# Altium footprint library Capacitor.PcbLib: 47 footprints (part 3 of 3)
Each footprint in its own frame and in the unit in brackets; x right, y up, seen from the top. Pads: shape width x height; smd on the part's side, far side on the other; paste and mask are expansions set on the pad; w line width, h text height; cw(c..) or ccw(c..) is an arc to the next point about the centre after c.
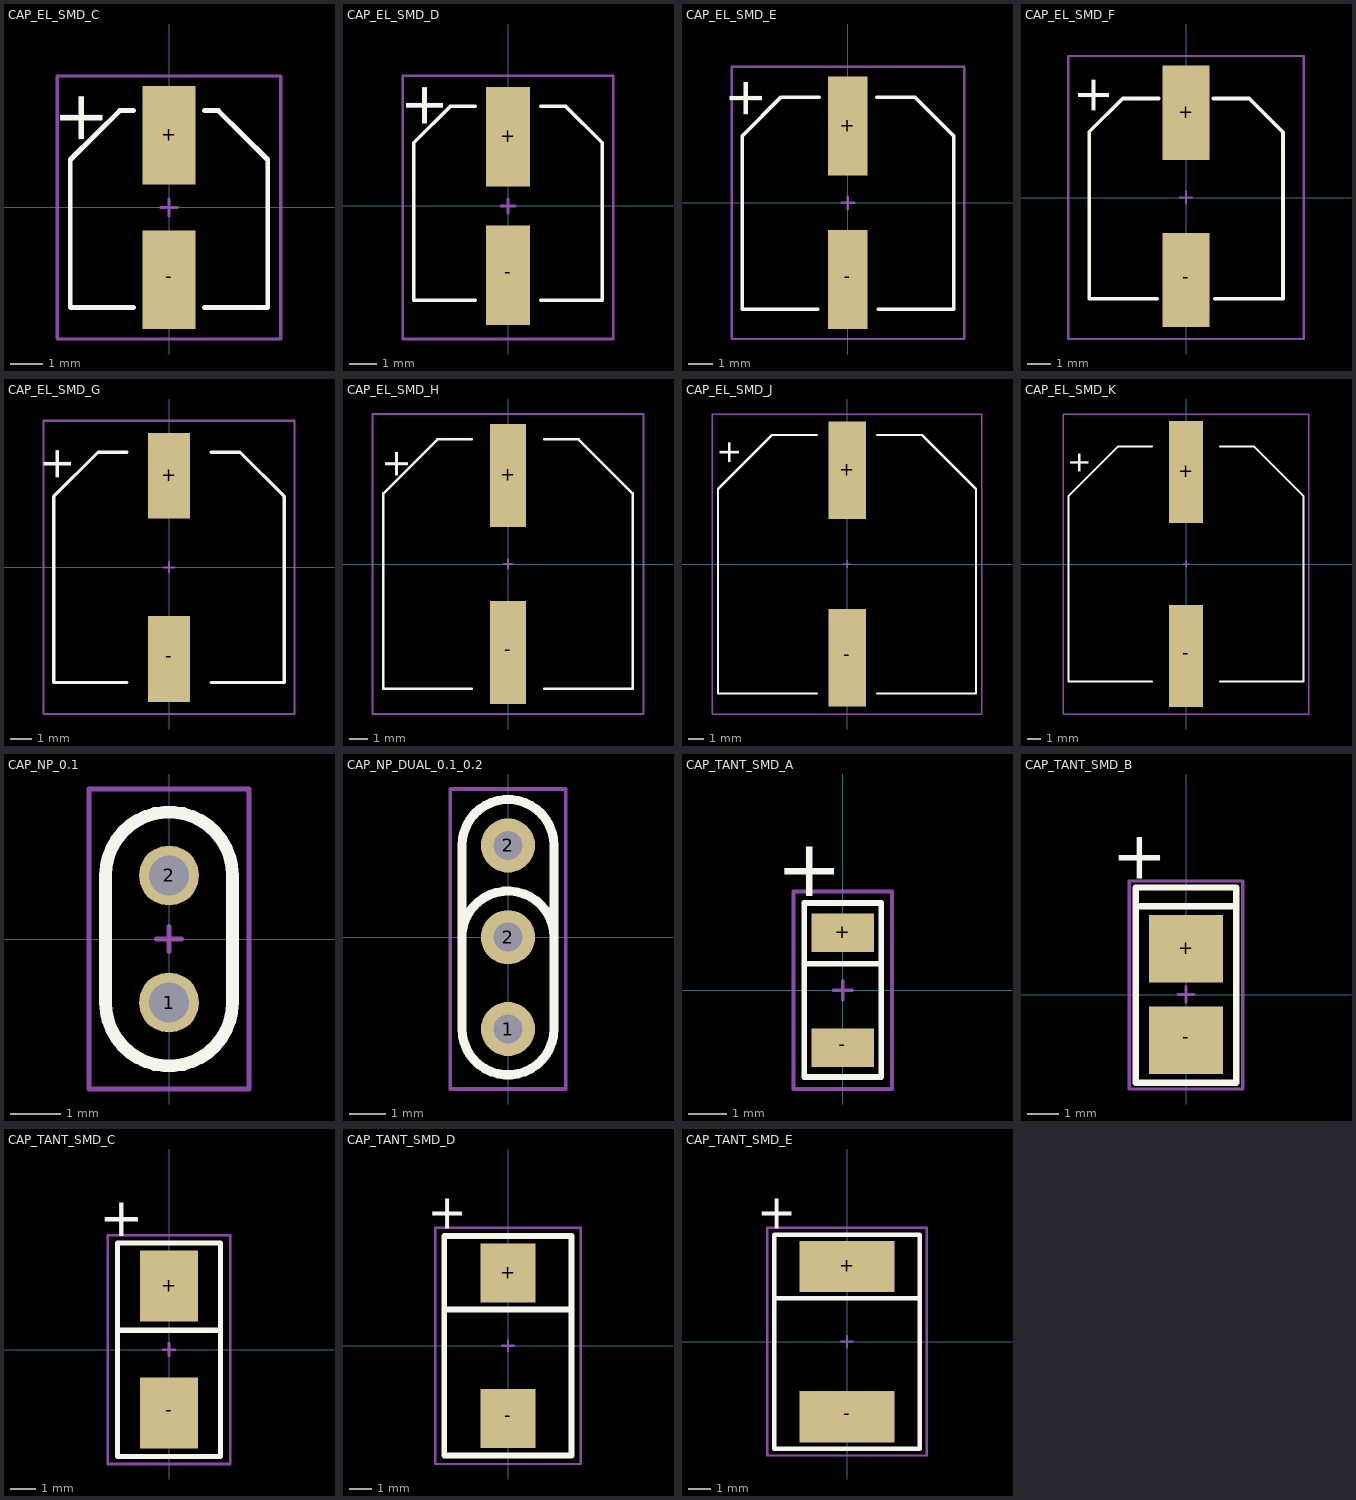
[diagram p2: the footprints below, top view; thin cyan lines are the x and y axes]

## CAP_EL_SMD_C [mil] "Capacitor Eletrolítico SMD Case C"
pads (2):
  rect 63x118 smd: +(0,86.6) -(0,-86.6)
Top Overlay:
  lines w5.9: -42.32,116.2 -58.4,116.2 -59.1,116 -117.9,57.5 -118.2,56.8 -118.2,-119.2 -117.8,-119.6 -42.24,-119.6 ; 42.24,-119.6 117.8,-119.6 118.2,-119.2 118.2,56.8 117.9,57.5 59.1,116 58.4,116.2 42.32,116.2
  text "+" at -129.92,141.73 h60
Mechanical 15:
  lines w3.94: -9.84,0 9.84,0 ; 0,-9.84 0,9.84 ; -133.86,-157.48 -133.86,157.48 133.86,157.48 133.86,-157.48 -133.86,-157.48
3D body "CAP_EL_SMD_C.STEP": height 212.99, standoff 0, extent -104.33,-118.11 104.33,114.18

## CAP_EL_SMD_D [mm] "Capacitor Eletrolítico SMD Case D"
pads (2):
  rect 1.6x3.6 smd: +(0,2.5) -(0,-2.5)
Top Overlay:
  lines w0.127: -1.175,-3.4 -3.4,-3.4 -3.4,2.275 -2.075,3.6 -1.175,3.6 ; 1.175,-3.4 3.4,-3.4 3.4,2.275 2.075,3.6 1.175,3.6
  text "+" at -3.675,4.5 h1.52
Mechanical 15:
  lines w0.1: -0.25,0 0.25,0 ; 0,-0.25 0,0.25 ; -3.8,-4.8 3.8,-4.8 3.8,4.7 -3.8,4.7 -3.8,-4.8
3D body "CAP_EL_SMD_D.STEP": height 5.4, standoff 0, extent -3.325,-3.375 3.275,3.625

## CAP_EL_SMD_E [mm] "Capacitor Eletrolítico SMD Case E"
pads (2):
  rect 1.6x4 smd: +(0,3.1) -(0,-3.1)
Top Overlay:
  lines w0.15: -1.225,-4.3 -4.275,-4.299 -4.275,2.708 -2.7,4.275 -1.167,4.275 ; 1.167,4.275 2.7,4.275 4.275,2.708 4.275,-4.299 1.225,-4.3
  text "+" at -4.775,5.1 h1.52
Mechanical 15:
  lines w0.1: -0.25,0 0.25,0 ; 0,-0.25 0,0.25 ; -4.7,-5.5 -4.7,5.5 4.7,5.5 4.7,-5.5 -4.7,-5.5
3D body "CAP_EL_SMD_E.STEP": height 6.2, standoff 0, extent -4.15,-4.5 4.15,4.5

## CAP_EL_SMD_F [mm] "Capacitor Eletrolítico SMD Case F"
pads (2):
  rect 2x4 smd: +(0,3.6) -(0,-3.5)
Top Overlay:
  lines w0.15: -1.225,-4.3 -4.1,-4.3 -4.1,2.789 -2.682,4.2 -1.167,4.2 ; 1.167,4.2 2.682,4.2 4.114,2.775 4.114,-4.3 1.225,-4.3
  text "+" at -4.575,5.2 h1.52
Mechanical 15:
  lines w0.1: -0.25,0 0.25,0 ; 0,-0.25 0,0.25 ; -5,-6 -5,6 5,6 5,-6 -5,-6
3D body "CAP_EL_SMD_F.STEP": height 10.2, standoff 0, extent -4.125,-5 4.175,4.9

## CAP_EL_SMD_G [mm] "Capacitor Eletrolítico SMD Case G"
pads (2):
  rect 2x4.1 smd paste+0: +(0,4.375) -(0,-4.375)
Top Overlay:
  lines w0.15: -2,-5.5 -5.5,-5.5 -5.5,3.39 -3.39,5.5 -2,5.5 ; 2,-5.5 5.5,-5.5 5.5,3.39 3.39,5.5 2,5.5
  text "+" at -5.975,5.8 h1.52
Mechanical 15:
  lines w0.1: -0.25,0 0.25,0 ; 0,-0.25 0,0.25 ; -6,-7 6,-7 6,7 -6,7 -6,-7
3D body "CAP_EL_SMD_G.STEP": height 10.2, standoff 0, extent -5.15,-5.775 5.15,5.825

## CAP_EL_SMD_H [mm] "Capacitor Eletrolítico SMD Case H"
pads (2):
  rect 2x5.7 smd paste+0: +(0,4.9) -(0,-4.9)
Top Overlay:
  lines w0.15: -2,-6.9 -6.9,-6.9 -6.9,3.9 -3.9,6.9 -2,6.9 ; 2,-6.9 6.9,-6.9 6.9,3.9 3.9,6.9 2,6.9
  text "+" at -6.8,6.4 h1.52
Mechanical 15:
  lines w0.1: -0.25,0 0.25,0 ; 0,-0.25 0,0.25 ; -7.5,-8.3 7.5,-8.3 7.5,8.3 -7.5,8.3 -7.5,-8.3
3D body "User Library-capacitor size H13.STEP": height 13.5, standoff -0.01, extent -6.75,-6.9 6.75,6.9

## CAP_EL_SMD_J [mm] "Capacitor Eletrolítico SMD Case J"
height 16.5
pads (2):
  rect 2.5x6.5 smd paste+0: +(0,6.25) -(0,-6.25)
Top Overlay:
  lines w0.15: -2,-8.625 -8.6,-8.625 -8.6,5 -5,8.6 -2,8.6 ; 2,-8.625 8.6,-8.625 8.6,5 5,8.6 2,8.6
  text "+" at -8.475,8.3 h1.52
Mechanical 15:
  lines w0.1: -0.25,0 0.25,0 ; 0,-0.25 0,0.25 ; -9,-10 9,-10 9,10 -9,10 -9,-10
3D body "Capacitor Elect size J16.step": height 16.5, standoff -0.01, extent -8.5,-8.85 8.5,8.85

## CAP_EL_SMD_K [mm] "Capacitor Eletrolítico SMD Case K"
pads (2):
  rect 2.5x7.5 smd paste+0: +(0,6.75) -(0,-6.75)
Top Overlay:
  lines w0.15: -2.5,-8.6 -8.6,-8.6 -8.6,5 -5,8.6 -2.5,8.6 ; 2.5,-8.6 8.6,-8.6 8.6,5 5,8.6 2.5,8.6
  text "+" at -8.475,8.3 h1.52
Mechanical 15:
  lines w0.1: -0.25,0 0.25,0 ; 0,-0.25 0,0.25 ; -9,-11 -9,11 9,11 9,-11 -9,-11
3D body "Capacitor Elect size J16.step": height 16.56, standoff 0.05, extent -8.5,-8.85 8.5,8.85

## CAP_NP_0.1 [mm] "Capacitor PTH"
pads (2):
  round 1.2 hole 0.8 mask+0.127: 1(0,-1.27) 2(0,1.27)
Top Overlay:
  lines w0.254: -1.27,-1.27 ccw(c0,-1.27) 1.27,-1.27 1.27,1.27 ccw(c0,1.27) -1.27,1.27 -1.27,-1.27
Mechanical 15:
  lines w0.1: -0.25,0 0.25,0 ; 0,-0.25 0,0.25 ; -1.6,-3 -1.6,3 1.6,3 1.6,-3 -1.6,-3
3D body "Capacitor Tantalo PTH.STEP": height 11.94, standoff -3.02, extent -1.587,-3.014 1.587,2.963

## CAP_NP_DUAL_0.1_0.2 [mm] "Capacitor PTH"
pads (3):
  round 1.5 hole 0.8 mask+0.127: 1(0,-2.54) 2(0,0) 2(0,2.54)
Top Overlay:
  lines w0.254: -1.27,0.127 cw(c0,0) 1.276,0 ; -1.27,-2.54 ccw(c0,-2.54) 1.27,-2.54 1.27,2.54 ccw(c0,2.54) -1.27,2.54 -1.27,-2.54
Mechanical 15:
  lines w0.1: -0.25,0 0.25,0 ; 0,-0.25 0,0.25 ; -1.6,-4.2 -1.6,4.1 1.6,4.1 1.6,-4.2 -1.6,-4.2
3D body "CAP_NP_0.1.step": height 4.27, standoff -2.47, extent -1.079,-2.794 1.08,2.794

## CAP_TANT_SMD_A [mil] "Capacitor Tantalo SMD Case A"
pads (2):
  rect 65x40 smd paste+0: +(0,59.6) -(0,-59.6)
Top Overlay:
  lines w5.9: -40,90.55 -40,-90 40,-90 40,90.55
  lines w6: -40,90.55 40,90.55 ; -39.37,27.56 39.37,27.56
  text "+" at 0,148.62 h60
Mechanical 15:
  lines w3.94: -9.84,0 9.84,0 ; 0,-9.84 0,9.84 ; -51.18,-102.36 -51.18,102.36 51.18,102.36 51.18,-102.36 -51.18,-102.36
3D body "CAP_TANT_SMD_A.step": height 63.39, standoff 0, extent -31.5,-62.81 31.5,62.81

## CAP_TANT_SMD_B [mm] "Capacitor Tantalo SMD Case B"
pads (2):
  rect 2.35x2.15 smd: +(0,1.45) -(0,-1.45)
Top Overlay:
  lines w0.2: -1.6,2.8 1.6,2.8 ; -1.6,-2.8 -1.6,3.4 1.6,3.4 1.6,-2.8 -1.6,-2.8
  text "+" at -0.6,5 h1.52
Mechanical 15:
  lines w0.1: -0.25,0 0.25,0 ; 0,-0.25 0,0.25 ; -1.8,-3 -1.8,3.6 1.8,3.6 1.8,-3 -1.8,-3
3D body "CAP_TANT_SMD_B.step": height 1.91, standoff 0, extent -1.425,-1.746 1.375,1.746

## CAP_TANT_SMD_C [mil] "Capacitor Tantalo SMD Case C"
pads (2):
  rect 90x110 smd: +(0,98.43) -(0,-98.43)
Top Overlay:
  lines w7.87: -80,30 80,30 ; -80,-165.35 80,-165.35 80,165.35 -80,165.35 -80,-165.35
  text "+" at -39.37,227.36 h60
Mechanical 15:
  lines w3.94: -9.84,0 9.84,0 ; 0,-9.84 0,9.84 ; -94.49,-177.17 94.49,-177.17 94.49,177.17 -94.49,177.17 -94.49,-177.17
3D body "CAP_TANT_SMD_C.step": height 98.82, standoff 0, extent -62.99,-117.01 62.99,118.97

## CAP_TANT_SMD_D [mm] "Capacitor Tantalo SMD Case D"
height 3.7
pads (2):
  rect 2.4x2.6 smd: +(0,3.2) -(0,-3.2)
Top Overlay:
  lines w0.254: -2.8,1.6 2.788,1.6 ; -2.8,-4.826 -2.8,4.826 2.794,4.826 2.794,-4.826 -2.8,-4.826
  text "+" at -1.8,6.475 h1.52
Mechanical 15:
  lines w0.1: -0.25,0 0.25,0 ; 0,-0.25 0,0.25 ; -3.2,-5.2 3.2,-5.2 3.2,5.2 -3.2,5.2 -3.2,-5.2
3D body "CAP_TANT_SMD_D.step": height 2.81, standoff 0, extent -2.1,-3.647 2.2,3.647

## CAP_TANT_SMD_E [mm] "Capacitor Tantalo SMD Case E"
pads (2):
  rect 4.15x2.25 smd: +(0,3.3) -(0,-3.3)
Top Overlay:
  lines w0.2: -3.2,1.9 3.2,1.9 ; -3.2,-4.7 -3.2,4.7 3.2,4.7 3.2,-4.7 -3.2,-4.7
  text "+" at -2.2,6.275 h1.52
Mechanical 15:
  lines w0.1: -0.25,0 0.25,0 ; 0,-0.25 0,0.25 ; -3.5,-5 3.5,-5 3.5,5 -3.5,5 -3.5,-5
3D body "CAP_TANT_SMD_E.step": height 4.11, standoff 0, extent -2.15,-3.622 2.15,3.672